# Altium footprint library Modules.PcbLib: 2 footprints
Each footprint in its own frame and in the unit in brackets; x right, y up, seen from the top. Pads: shape width x height; smd on the part's side, far side on the other; paste and mask are expansions set on the pad; w line width, h text height; cw(c..) or ccw(c..) is an arc to the next point about the centre after c.
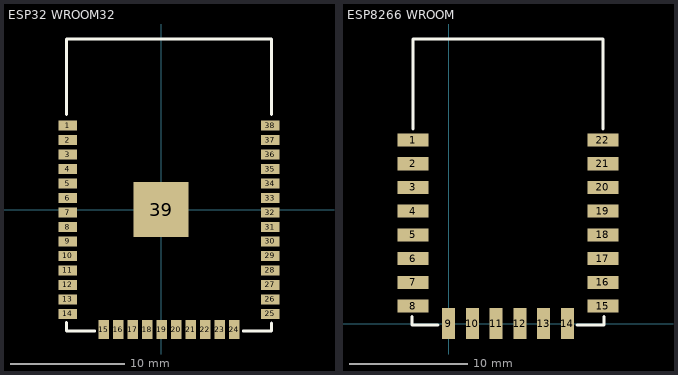
[diagram p0: the footprints below, top view; thin cyan lines are the x and y axes]

## ESP32 WROOM32 [mm] "ESP32 WIFI & BLUETOOTH DUAL"
pads (39):
  rect 1.65x0.9 smd: 1(-8.175,7.362) 2(-8.175,6.092) 3(-8.175,4.822) 4(-8.175,3.552) 5(-8.175,2.282) 6(-8.175,1.012) 7(-8.175,-0.258) 8(-8.175,-1.528) 9(-8.175,-2.798) 10(-8.175,-4.068) 11(-8.175,-5.338) 12(-8.175,-6.608) 13(-8.175,-7.878) 14(-8.175,-9.148) 25(9.574,-9.148) 26(9.574,-7.878) 27(9.574,-6.608) 28(9.574,-5.338) 29(9.574,-4.068) 30(9.574,-2.798) 31(9.574,-1.528) 32(9.574,-0.258) 33(9.574,1.012) 34(9.574,2.282) 35(9.574,3.552) 36(9.574,4.822) 37(9.574,6.092) 38(9.574,7.362)
  rect 0.9x1.65 smd: 15(-5.02,-10.523) 16(-3.75,-10.523) 17(-2.48,-10.523) 18(-1.21,-10.523) 19(0.06,-10.523) 20(1.33,-10.523) 21(2.6,-10.523) 22(3.87,-10.523) 23(5.14,-10.523) 24(6.41,-10.523)
  rect 4.8x4.8 smd: 39(0,0)
Top Layer:
  lines w0.01: 0,-0.92 0,-0.91
Top Overlay:
  lines w0.254: -8.3,8.352 -8.3,14.957 9.7,14.957 9.7,8.352 ; -5.814,-10.648 -8.3,-10.648 -8.3,-9.883 ; 7.208,-10.648 9.7,-10.648 9.7,-9.958 cw(c9.7,-9.958) 9.7,-9.957 ; -8.301,-9.883 ccw(c-8.301,-9.883) -8.3,-9.883
3D body "User Library-ESP321.step": height 2.91, standoff -0.01, extent -8.313,-10.679 9.687,14.821

## ESP8266 WROOM [mm] "WiFi 802.11b/g/n Transceiver Module 2.4GHz Integrated, Trace Surface Mount"
pads (22):
  rect 2.6x1.1 smd: 1(-3,15.48) 2(-3,13.48) 3(-3,11.48) 4(-3,9.48) 5(-3,7.48) 6(-3,5.48) 7(-3,3.48) 8(-3,1.48) 15(13,1.48) 16(13,3.48) 17(13,5.48) 18(13,7.48) 19(13,9.48) 20(13,11.48) 21(13,13.48) 22(13,15.48)
  rect 1.1x2.6 smd: 9(0,0) 10(2,0) 11(4,0) 12(6,0) 13(8,0) 14(10,0)
Top Overlay:
  lines w0.254: -3.1,0.6 -3.1,-0.1 -0.9,-0.1 ; -3,16.4 -3,24 13,24 13,16.4 ; 10.8,-0.1 13.1,-0.1 13.1,0.6
3D body "LED 0402 Blue.step": height 1.1, standoff 0.65, extent 10.495,17.85 11.505,18.35
3D body "EPS8266 ESP-12E.step": height 2.65, standoff -0.04, extent -3.005,-0.005 13.005,24